# Altium footprint library TinyShuffle v.0.PcbLib: 54 footprints (part 4 of 4)
Each footprint in its own frame and in the unit in brackets; x right, y up, seen from the top. Pads: shape width x height; smd on the part's side, far side on the other; paste and mask are expansions set on the pad; w line width, h text height; cw(c..) or ccw(c..) is an arc to the next point about the centre after c.
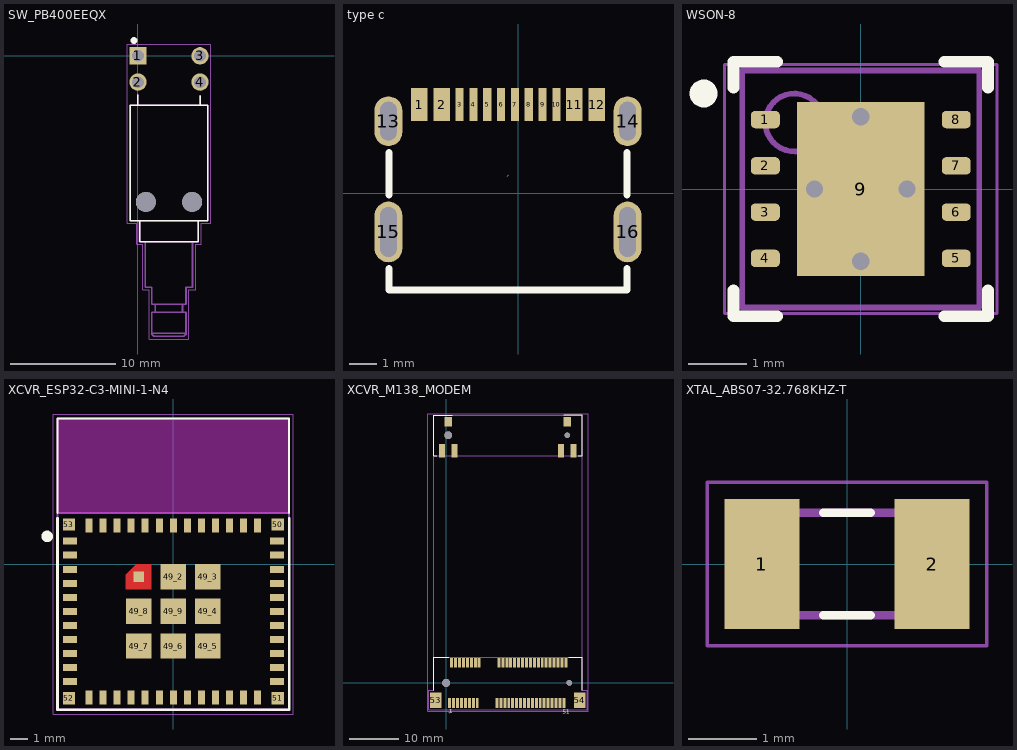
[diagram p3: the footprints below, top view; thin cyan lines are the x and y axes]

## SW_PB400EEQX [mm]
pads (6):
  rect 1.65x1.65 hole 1.1: 1(0,0)
  round 1.65 hole 1.1: 2(0,-2.5) 3(5.9,0) 4(5.9,-2.5)
  round 1.9 hole 1.9 unplated: ""(0.75,-13.9) ""(5.15,-13.9)
Top Overlay:
  circle w0.35: c-0.381,1.448 r0.152
  lines w0.127: 0,-3.708 0,-4.69 ; 0.15,-15.7 0.15,-17.69 5.75,-17.69 5.75,-15.7 ; 5.9,-3.81 5.9,-4.69 ; 0,-4.69 -0.75,-4.69 -0.75,-15.69 6.65,-15.69 6.65,-4.69 5.9,-4.69 ; 0,-4.69 5.9,-4.69
Top Assembly (Mech11):
  lines w0.127: -0.025,-3.708 -0.025,-4.69 ; 0.125,-15.7 0.125,-17.69 5.725,-17.69 5.725,-15.7 ; 0.675,-17.7 0.675,-22 1.3,-22 1.3,-23.64 4.55,-23.64 4.55,-22 5.175,-22 5.175,-17.7 ; 1.325,-26.4 4.525,-26.4 ; 1.625,-23.7 1.625,-24.4 ; 4.225,-23.7 4.225,-24.4 ; 5.875,-3.81 5.875,-4.69 ; -0.025,-4.69 -0.775,-4.69 -0.775,-15.69 6.625,-15.69 6.625,-4.69 5.875,-4.69 ; -0.025,-4.69 5.875,-4.69 ; 1.625,-24.4 4.225,-24.4 ; 1.625,-24.4 1.3,-24.4 1.3,-26.49 1.5,-26.69 4.35,-26.69 4.55,-26.49 4.55,-24.4 4.225,-24.4
Top 3D Body:
  lines w0.127: 0,-3.734 0,-4.69 ; 0.15,-15.7 0.15,-17.69 5.75,-17.69 5.75,-15.7 ; 0.7,-17.7 0.7,-22 1.325,-22 1.325,-23.64 4.575,-23.64 4.575,-22 5.2,-22 5.2,-17.7 ; 1.35,-26.4 4.55,-26.4 ; 1.65,-23.7 1.65,-24.4 ; 4.25,-23.7 4.25,-24.4 ; 5.9,-3.734 5.9,-4.69 ; 0,-4.69 -0.75,-4.69 -0.75,-15.69 6.65,-15.69 6.65,-4.69 5.9,-4.69 ; 0,-4.69 5.9,-4.69 ; 1.65,-24.4 4.25,-24.4 ; 1.65,-24.4 1.325,-24.4 1.325,-26.49 1.525,-26.69 4.375,-26.69 4.575,-26.49 4.575,-24.4 4.25,-24.4
Top Courtyard:
  lines w0.05: -1,-15.94 -0.1,-15.94 -0.1,-17.94 0.45,-17.94 0.45,-22.25 1.075,-22.25 1.075,-26.94 4.825,-26.94 4.825,-22.25 5.5,-22.25 5.5,-17.94 6,-17.94 6,-15.94 6.9,-15.94 6.9,1.1 -1,1.1 -1,-15.94
3D body "PB400EEQX--3DModel-STEP-520916.STEP": height 10.07, standoff -2.68, extent -0.762,-26.759 6.638,0.851

## type c [mm]
pads (16):
  rect 0.6x1.2 smd: 1(-3.579,3.203) 2(-2.779,3.203) 11(2.021,3.203) 12(2.821,3.203)
  rect 0.3x1.2 smd: 3(-2.129,3.203) 4(-1.629,3.203) 5(-1.129,3.203) 6(-0.629,3.203) 7(-0.129,3.203) 8(0.371,3.203) 9(0.871,3.203) 10(1.371,3.203)
  oval 1x1.8 hole 0.6 slot 1.4 at 90 deg: 13(-4.699,2.603) 14(3.941,2.603)
  oval 1x2.2 hole 0.6 slot 1.8 at 90 deg: 15(-4.699,-1.397) 16(3.941,-1.397)
Top Overlay:
  lines w0.254: -4.679,-2.728 -4.679,-3.497 3.921,-3.497 3.921,-2.728 ; -4.679,-0.066 -4.679,1.472 ; 3.921,-0.066 3.921,1.472
Top Courtyard:
  lines w0.003: -0.404,0.621 -0.354,0.672

## WSON-8 [mm] "SON, 8-Leads, Body 4,00x4,00mm, Pitch 0,80mm, Thermal Pad 2,20x2,29mm, IPC High Density"
height 0.8
pads (9):
  rrect50% 0.5x0.3 smd: 1(-1.65,1.2) 2(-1.65,0.4) 3(-1.65,-0.4) 4(-1.65,-1.2) 5(1.65,-1.2) 6(1.65,-0.4) 7(1.65,0.4) 8(1.65,1.2)
  rect 2.2x3 smd paste-3: 9(0,0)
via 0,-1.25 diameter 0.5 hole 0.3
via 0,1.25 diameter 0.5 hole 0.3
via 0.8,0 diameter 0.5 hole 0.3
via -0.8,0 diameter 0.5 hole 0.3
Top Overlay:
  circle w0.254: c-2.718,1.651 r0.114
  lines w0.2: -2.2,-1.75 -2.2,-2.2 -1.445,-2.2 ; -2.2,1.75 -2.2,2.2 -1.445,2.2 ; 1.445,-2.2 2.2,-2.2 2.2,-1.75 ; 1.445,2.2 2.2,2.2 2.2,1.75
Top Paste:
  rectangle: 0.1,-1.41 1.08,-0.1
  rectangle: -1.08,-1.41 -0.1,-0.1
  rectangle: 0.1,0.1 1.08,1.41
  rectangle: -1.08,0.1 -0.1,1.41
Bottom Assembly (Mech12):
  circle w0.1: c-1.15,1.15 r0.5
  lines w0.1: -2.05,-2.05 2.05,-2.05 2.05,2.05 -2.05,2.05 -2.05,-2.05
Top Courtyard:
  lines w0.05: -2.355,-2.15 2.355,-2.15 2.355,2.15 -2.355,2.15 -2.355,-2.15
  lines w0.1: -0.5,0 0.5,0 ; 0,-0.5 0,0.5
3D body: height 0.8, standoff 0.1, extent -2.05,-2.05 2.05,2.05

## XCVR_ESP32-C3-MINI-1-N4 [mm]
pads (61):
  rect 0.8x0.4 smd: 1(-5.9,1.3) 2(-5.9,0.5) 3(-5.9,-0.3) 4(-5.9,-1.1) 5(-5.9,-1.9) 6(-5.9,-2.7) 7(-5.9,-3.5) 8(-5.9,-4.3) 9(-5.9,-5.1) 10(-5.9,-5.9) 11(-5.9,-6.7) 25(5.9,-6.7) 26(5.9,-5.9) 27(5.9,-5.1) 28(5.9,-4.3) 29(5.9,-3.5) 30(5.9,-2.7) 31(5.9,-1.9) 32(5.9,-1.1) 33(5.9,-0.3) 34(5.9,0.5) 35(5.9,1.3)
  rect 0.4x0.8 smd: 12(-4.8,-7.6) 13(-4,-7.6) 14(-3.2,-7.6) 15(-2.4,-7.6) 16(-1.6,-7.6) 17(-0.8,-7.6) 18(0,-7.6) 19(0.8,-7.6) 20(1.6,-7.6) 21(2.4,-7.6) 22(3.2,-7.6) 23(4,-7.6) 24(4.8,-7.6) 36(4.8,2.2) 37(4,2.2) 38(3.2,2.2) 39(2.4,2.2) 40(1.6,2.2) 41(0.8,2.2) 42(0,2.2) 43(-0.8,2.2) 44(-1.6,2.2) 45(-2.4,2.2) 46(-3.2,2.2) 47(-4,2.2) 48(-4.8,2.2)
  rect 0.6x0.6 smd paste-1 mask+0: 49_1(-1.975,-0.725)
  rect 1.45x1.45 smd: 49_2(0,-0.725) 49_3(1.975,-0.725) 49_4(1.975,-2.7) 49_5(1.975,-4.675) 49_6(0,-4.675) 49_7(-1.975,-4.675) 49_8(-1.975,-2.7) 49_9(0,-2.7)
  rect 0.7x0.7 smd: 50(5.95,2.25) 51(5.95,-7.65) 52(-5.95,-7.65) 53(-5.95,2.25)
Top Layer:
  region: -1.25,-1.45 -2.7,-1.45 -2.7,-0.6 -2.1,0 -1.25,0
Top Overlay:
  circle w0.35: c-7.188,1.575 r0.152
  lines w0.127: -6.6,2.92 -6.6,8.3 6.6,8.3 6.6,2.92
  lines w0.152: -6.6,2.6 -6.6,-8.3 6.6,-8.3 6.6,2.6
Top Paste:
  region: -1.25,-1.45 -2.7,-1.45 -2.7,-0.6 -2.1,0 -1.25,0
Top Solder:
  region: -1.15,-1.55 -2.8,-1.55 -2.8,-0.56 -2.14,0.1 -1.15,0.1
Keep-Out Layer:
  region: 6.6,2.9 -6.6,2.9 -6.6,8.3 6.6,8.3
  region: 6.6,2.9 -6.6,2.9 -6.6,8.3 6.6,8.3
Top Assembly (Mech11):
  circle w0.2: c-7.188,1.575 r0.1
  lines w0.127: -6.6,2.9 6.6,2.9 ; -6.6,2.9 -6.6,8.3 6.6,8.3 6.6,2.9 ; -6.6,2.9 -6.6,-8.3 6.6,-8.3 6.6,2.9
  text "'.Designator'" at -2.396,-3.12 h1.1
Top Courtyard:
  lines w0.05: -6.85,-8.55 6.85,-8.55 6.85,8.55 -6.85,8.55 -6.85,-8.55
3D body "step_temp.STEP": height 2.55, standoff 0, extent -6.6,-8.3 6.6,8.3

## XCVR_M138_MODEM [mm]
pads (64):
  rect 0.6x2 smd: 1(0.7,-4.1) 2(1.1,4.1) 3(1.5,-4.1) 4(1.9,4.1) 5(2.3,-4.1) 6(2.7,4.1) 7(3.1,-4.1) 8(3.5,4.1) 9(3.9,-4.1) 10(4.3,4.1) 11(4.7,-4.1) 12(5.1,4.1) 13(5.5,-4.1) 14(5.9,4.1) 15(6.3,-4.1) 16(6.7,4.1) 17(10.3,-4.1) 18(10.7,4.1) 19(11.1,-4.1) 20(11.5,4.1) 21(11.9,-4.1) 22(12.3,4.1) 23(12.7,-4.1) 24(13.1,4.1) 25(13.5,-4.1) 26(13.9,4.1) 27(14.3,-4.1) 28(14.7,4.1) 29(15.1,-4.1) 30(15.5,4.1) 31(15.9,-4.1) 32(16.3,4.1) 33(16.7,-4.1) 34(17.1,4.1) 35(17.5,-4.1) 36(17.9,4.1) 37(18.3,-4.1) 38(18.7,4.1) 39(19.1,-4.1) 40(19.5,4.1) 41(19.9,-4.1) 42(20.3,4.1) 43(20.7,-4.1) 44(21.1,4.1) 45(21.5,-4.1) 46(21.9,4.1) 47(22.3,-4.1) 48(22.7,4.1) 49(23.1,-4.1) 50(23.5,4.1) 51(23.9,-4.1) 52(24.3,4.1)
  rect 2.3x3.2 smd: 53(-2.15,-3.5) 54(27.15,-3.5)
  rect 1.5x1.9 smd: S1_1(0.4,53.05) S2_1(24.6,53.05)
  rect 1.2x2.7 smd: S1_2(-0.85,47.15) S1_3(1.65,47.15) S2_2(23.35,47.15) S2_3(25.85,47.15)
  round 1.63 hole 1.63 unplated: ""(0,0)
  round 1.58 hole 1.58 unplated: ""(0.4,50.3)
  round 1.08 hole 1.08 unplated: ""(24.6,50.3)
  round 1.13 hole 1.13 unplated: ""(25,0)
Top Overlay:
  lines w0.127: -2.54,-1.503 -2.54,5.227 0.463,5.227 ; -2.54,54.371 -2.54,46.139 -1.882,46.139 ; -2.515,54.394 1.245,54.394 ; 23.824,54.423 27.583,54.423 ; 24.937,5.227 27.61,5.227 27.61,-1.503 ; 26.78,46.139 27.61,46.139 27.61,54.371
  text "51" at 23.706,-6.317 h0.8
  text "1" at 0.566,-6.215 h0.8
Top Solder:
  rectangle: 9.918,-5.232 24.333,-2.997
  rectangle: 10.363,3.023 24.778,5.232
  rectangle: 0.686,3.023 7.087,5.232
  rectangle: 0.305,-5.207 6.706,-2.997
Top Assembly (Mech11):
  circle w0.2: c0.66,-5.918 r0.1
  lines w0.127: -2.54,-1.524 -3.505,-1.524 -3.505,-5.461 28.6,-5.461 28.6,-1.524 27.61,-1.524 ; -2.54,5.227 -2.54,46.139 27.61,46.139 27.61,5.227 -2.54,5.227
  text "'.Designator'" at 7.8,25.989 h1.6
Top 3D Body:
  lines w0.127: -2.54,-1.524 -2.54,5.227 ; -2.54,46.139 -2.54,54.371 27.61,54.371 27.61,46.139 ; 27.61,-1.524 27.61,5.227
Top Courtyard:
  lines w0.05: -3.755,-5.711 28.85,-5.711 28.85,54.621 -3.755,54.621 -3.755,-5.711
3D body "K3D-MM60-EZH039-B5-R2 JAE Connector Division Proprietary.STEP": height 4.8, standoff -0.8, extent -1.985,46.418 27.015,54.318
3D body "K3D-MM60-52B1-B1-R2 JAE Connector Division Proprietary.STEP": height 3.9, standoff -0.8, extent -2.404,-4.873 27.296,5.127
3D body "TILE-LB_102120211208.step": height 6.9, standoff 1.77, extent -2.357,0.169 27.643,51.119

## XTAL_ABS07-32.768KHZ-T [mm]
pads (2):
  rect 1.1x1.9 smd paste-0.03: 1(-1.25,0) 2(1.25,0)
Top Overlay:
  lines w0.127: -0.35,-0.75 0.35,-0.75 ; -0.35,0.75 0.35,0.75
Top 3D Body:
  lines w0.127: -1.6,-0.75 1.6,-0.75 1.6,0.75 -1.6,0.75 -1.6,-0.75
Top Courtyard:
  lines w0.05: -2.05,-1.2 2.05,-1.2 2.05,1.2 -2.05,1.2 -2.05,-1.2
3D body "ABS07-32.768KHZ-T--3DModel-STEP-400430.STEP": height 0.89, standoff 0, extent -1.6,-0.749 1.6,0.749